# Altium footprint library devices.PCBLIB: 335 footprints (part 14 of 21)
Each footprint in its own frame and in the unit in brackets; x right, y up, seen from the top. Pads: shape width x height; smd on the part's side, far side on the other; paste and mask are expansions set on the pad; w line width, h text height; cw(c..) or ccw(c..) is an arc to the next point about the centre after c.
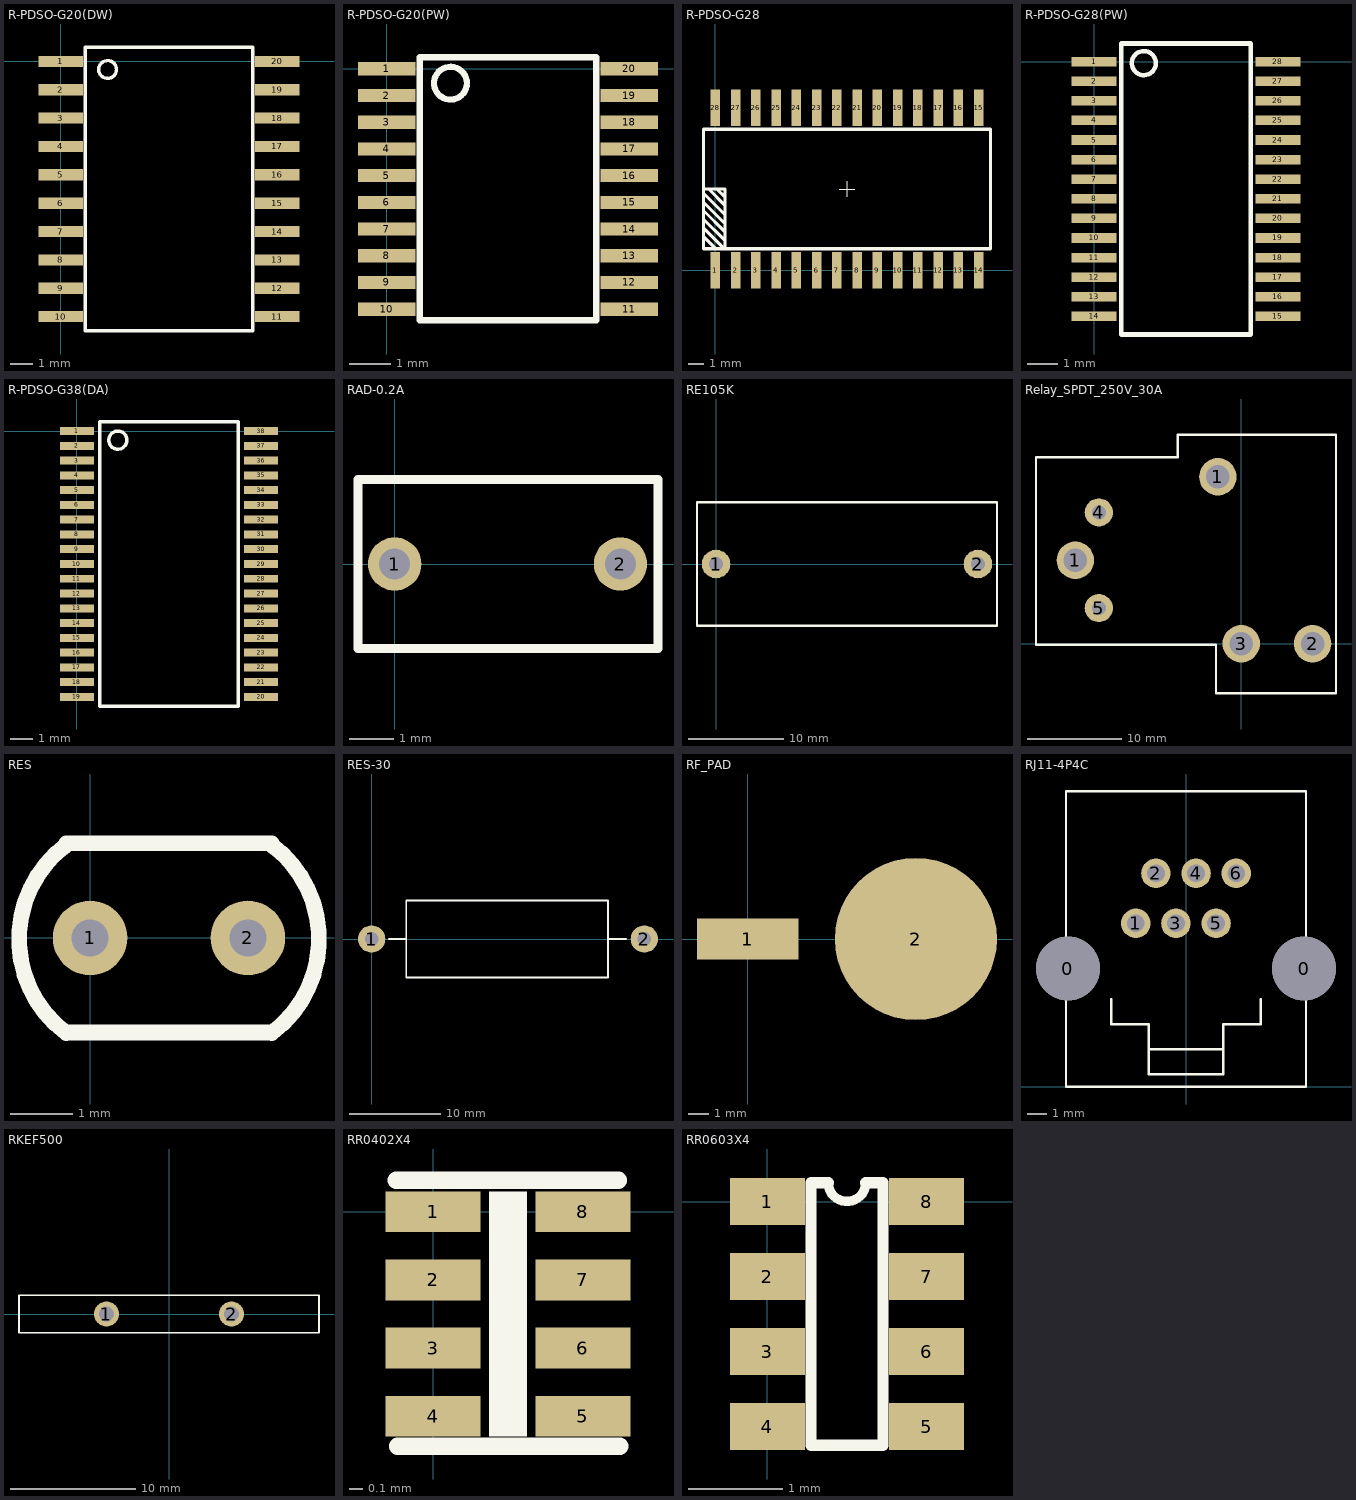
[diagram p13: the footprints below, top view; thin cyan lines are the x and y axes]

## R-PDSO-G20(DW) [mm]
pads (20):
  rect 2x0.5 smd: 1(0,0) 2(0,-1.27) 3(0,-2.54) 4(0,-3.81) 5(0,-5.08) 6(0,-6.35) 7(0,-7.62) 8(0,-8.89) 9(0,-10.16) 10(0,-11.43) 11(9.7,-11.43) 12(9.7,-10.16) 13(9.7,-8.89) 14(9.7,-7.62) 15(9.7,-6.35) 16(9.7,-5.08) 17(9.7,-3.81) 18(9.7,-2.54) 19(9.7,-1.27) 20(9.7,0)
Top Overlay:
  circle w0.15: c2.1,-0.365 r0.4
  lines w0.152: 1.1,-12.065 8.6,-12.065 8.6,0.635 1.1,0.635 1.1,-12.065

## R-PDSO-G20(PW) [mm]
pads (20):
  rect 1.4x0.32 smd: 1(0,0) 2(0,-0.65) 3(0,-1.3) 4(0,-1.95) 5(0,-2.6) 6(0,-3.25) 7(0,-3.9) 8(0,-4.55) 9(0,-5.2) 10(0,-5.85) 11(5.9,-5.85) 12(5.9,-5.2) 13(5.9,-4.55) 14(5.9,-3.9) 15(5.9,-3.25) 16(5.9,-2.6) 17(5.9,-1.95) 18(5.9,-1.3) 19(5.9,-0.65) 20(5.9,0)
Top Overlay:
  circle w0.15: c1.55,-0.35 r0.4
  lines w0.152: 0.8,-6.12 0.8,0.28 5.1,0.28 5.1,-6.12 0.807,-6.12

## R-PDSO-G28 [mm]
pads (28):
  rect 0.6x2.3 smd: 1(0,0) 2(1.27,0) 3(2.54,0) 4(3.81,0) 5(5.08,0) 6(6.35,0) 7(7.62,0) 8(8.89,0) 9(10.16,0) 10(11.43,0) 11(12.7,0) 12(13.97,0) 13(15.24,0) 14(16.51,0) 15(16.51,10.2) 16(15.24,10.2) 17(13.97,10.2) 18(12.7,10.2) 19(11.43,10.2) 20(10.16,10.2) 21(8.89,10.2) 22(7.62,10.2) 23(6.35,10.2) 24(5.08,10.2) 25(3.81,10.2) 26(2.54,10.2) 27(1.27,10.2) 28(0,10.2)
Top Overlay:
  lines w0: 7.755,5.1 8.755,5.1 ; 8.255,4.6 8.255,5.6
  lines w0.2: -0.745,3.21 0.615,1.85 ; -0.745,3.75 0.615,2.39 ; -0.745,4.28 0.545,2.99 ; -0.745,4.83 0.615,3.47 ; -0.735,2.11 -0.045,1.42 ; -0.725,2.65 0.505,1.42 ; -0.685,5.1 0.615,5.1 0.615,1.4 ; -0.425,5.1 0.615,4.06 ; 0.095,5.1 0.615,4.58 ; -0.745,1.35 17.255,1.35 17.255,8.85 -0.745,8.85 -0.745,1.35

## R-PDSO-G28(PW) [mm]
pads (28):
  rect 1.5x0.32 smd: 1(0,0) 2(0,-0.65) 3(0,-1.3) 4(0,-1.95) 5(0,-2.6) 6(0,-3.25) 7(0,-3.9) 8(0,-4.55) 9(0,-5.2) 10(0,-5.85) 11(0,-6.5) 12(0,-7.15) 13(0,-7.8) 14(0,-8.45) 15(6.1,-8.45) 16(6.1,-7.8) 17(6.1,-7.15) 18(6.1,-6.5) 19(6.1,-5.85) 20(6.1,-5.2) 21(6.1,-4.55) 22(6.1,-3.9) 23(6.1,-3.25) 24(6.1,-2.6) 25(6.1,-1.95) 26(6.1,-1.3) 27(6.1,-0.65) 28(6.1,0)
Top Overlay:
  circle w0.15: c1.65,-0.05 r0.4
  lines w0.152: 0.9,-9.05 0.9,0.6 5.2,0.6 5.2,-9.05 0.907,-9.05

## R-PDSO-G38(DA) [mm]
pads (38):
  rect 1.5x0.35 smd: 1(0,0) 2(0,-0.65) 3(0,-1.3) 4(0,-1.95) 5(0,-2.6) 6(0,-3.25) 7(0,-3.9) 8(0,-4.55) 9(0,-5.2) 10(0,-5.85) 11(0,-6.5) 12(0,-7.15) 13(0,-7.8) 14(0,-8.45) 15(0,-9.1) 16(0,-9.75) 17(0,-10.4) 18(0,-11.05) 19(0,-11.7) 20(8.1,-11.7) 21(8.1,-11.05) 22(8.1,-10.4) 23(8.1,-9.75) 24(8.1,-9.1) 25(8.1,-8.45) 26(8.1,-7.8) 27(8.1,-7.15) 28(8.1,-6.5) 29(8.1,-5.85) 30(8.1,-5.2) 31(8.1,-4.55) 32(8.1,-3.9) 33(8.1,-3.25) 34(8.1,-2.6) 35(8.1,-1.95) 36(8.1,-1.3) 37(8.1,-0.65) 38(8.1,0)
Top Overlay:
  circle w0.15: c1.8,-0.4 r0.4
  lines w0.152: 1,-12.1 1,0.4 7.1,0.4 7.1,-12.1 1,-12.1

## RAD-0.2A [mm]
pads (2):
  round 1.2 hole 0.7: 1(0,0) 2(5.08,0)
Top Overlay:
  lines w0.2: -0.825,-1.905 5.925,-1.905 5.925,1.905 -0.825,1.905 -0.825,-1.905

## RE105K [mm]
pads (2):
  round 3 hole 1.5: 1(0,0) 2(27.5,0)
Top Overlay:
  lines w0.254: -2,-6.5 29.5,-6.5 29.5,6.5 -2,6.5 -2,-6.5

## Relay_SPDT_250V_30A [mm]
pads (6):
  round 4 hole 2.5: 1(-17.7,8.9) 1(-2.5,17.8) 2(7.6,0) 3(0,0)
  round 3 hole 1.5: 4(-15.2,14) 5(-15.2,3.8)
Top Overlay:
  lines w0.254: -21.9,-0.1 -21.9,19.9 -6.8,19.9 -6.8,22.3 10.1,22.3 10.1,-5.3 -2.7,-5.3 -2.7,-0.1 -21.9,-0.1

## RES [mm]
pads (2):
  round 1.2 hole 0.6: 1(0,0) 2(2.54,0)
Top Overlay:
  lines w0.254: -0.386,-1.53 cw(c0.743,-0.017) -0.37,1.508 ; -0.381,-1.524 2.921,-1.524 ; -0.381,1.524 2.921,1.524 ; 2.91,1.508 cw(c1.797,-0.017) 2.926,-1.53

## RES-30 [mm]
pads (2):
  round 3 hole 1.5: 1(0,0) 2(30,0)
Top Overlay:
  lines w0.2: 1.905,0 3.81,0 ; 26.095,0 28,0 ; 3.81,-4.25 3.81,4.25 26,4.25 26,-4.25 3.81,-4.25

## rf [mm]

## RF_PAD [mm]
pads (2):
  rect 5x2 smd: 1(0,0)
  round 8 smd: 2(8.3,0)

## RJ11-4P4C [mm]
height 6.86
pads (8):
  round 3.25 hole 3.25: 0(-6,6) 0(6,6)
  round 1.5 hole 0.9: 1(-2.55,8.3) 2(-1.53,10.84) 3(-0.51,8.3) 4(0.51,10.84) 5(1.53,8.3) 6(2.55,10.84)
Top Overlay:
  lines w0.127: -3.81,4.445 -3.81,3.175 -2.54,3.175 -1.905,3.175 -1.905,0.635 1.905,0.635 1.905,3.175 2.54,3.175 3.81,3.175 3.81,4.445 ; -1.905,1.905 1.905,1.905 ; -6.1,0 -6.1,15 1,15 6.1,15 6.1,0 0,0 -6.1,0

## RKEF500 [mm]
pads (2):
  round 2 hole 1.2: 1(-5,0) 2(5,0)
Top Overlay:
  lines w0.127: -12,-1.5 -12,0 -12,1.2 -12,1.5 12,1.5 12,-1.5 -12,-1.5

## RR0402X4 [mm]
pads (8):
  rect 0.7x0.3 smd: 1(0,0) 2(0,-0.5) 3(0,-1) 4(0,-1.5) 5(1.1,-1.5) 6(1.1,-1) 7(1.1,-0.5) 8(1.1,0)
Top Overlay:
  rectangle: 0.41,-1.65 0.69,0.15
  lines w0.127: -0.27,0.23 1.36,0.23 ; -0.26,-1.72 1.37,-1.72

## RR0603X4 [mm]
pads (8):
  rect 0.8x0.5 smd: 1(0,0) 2(0,-0.8) 3(0,-1.6) 4(0,-2.4) 5(1.7,-2.4) 6(1.7,-1.6) 7(1.7,-0.8) 8(1.7,0)
Top Overlay:
  lines w0.1: 0.65,0.2 ccw(c0.85,0.2) 1.05,0.2
  lines w0.12: 0.65,0.2 0.465,0.2 0.465,-2.6 1.235,-2.6 1.235,0.2 1.05,0.2